# Altium footprint library asib.PcbLib: 45 footprints (part 3 of 3)
Each footprint in its own frame and in the unit in brackets; x right, y up, seen from the top. Pads: shape width x height; smd on the part's side, far side on the other; paste and mask are expansions set on the pad; w line width, h text height; cw(c..) or ccw(c..) is an arc to the next point about the centre after c.
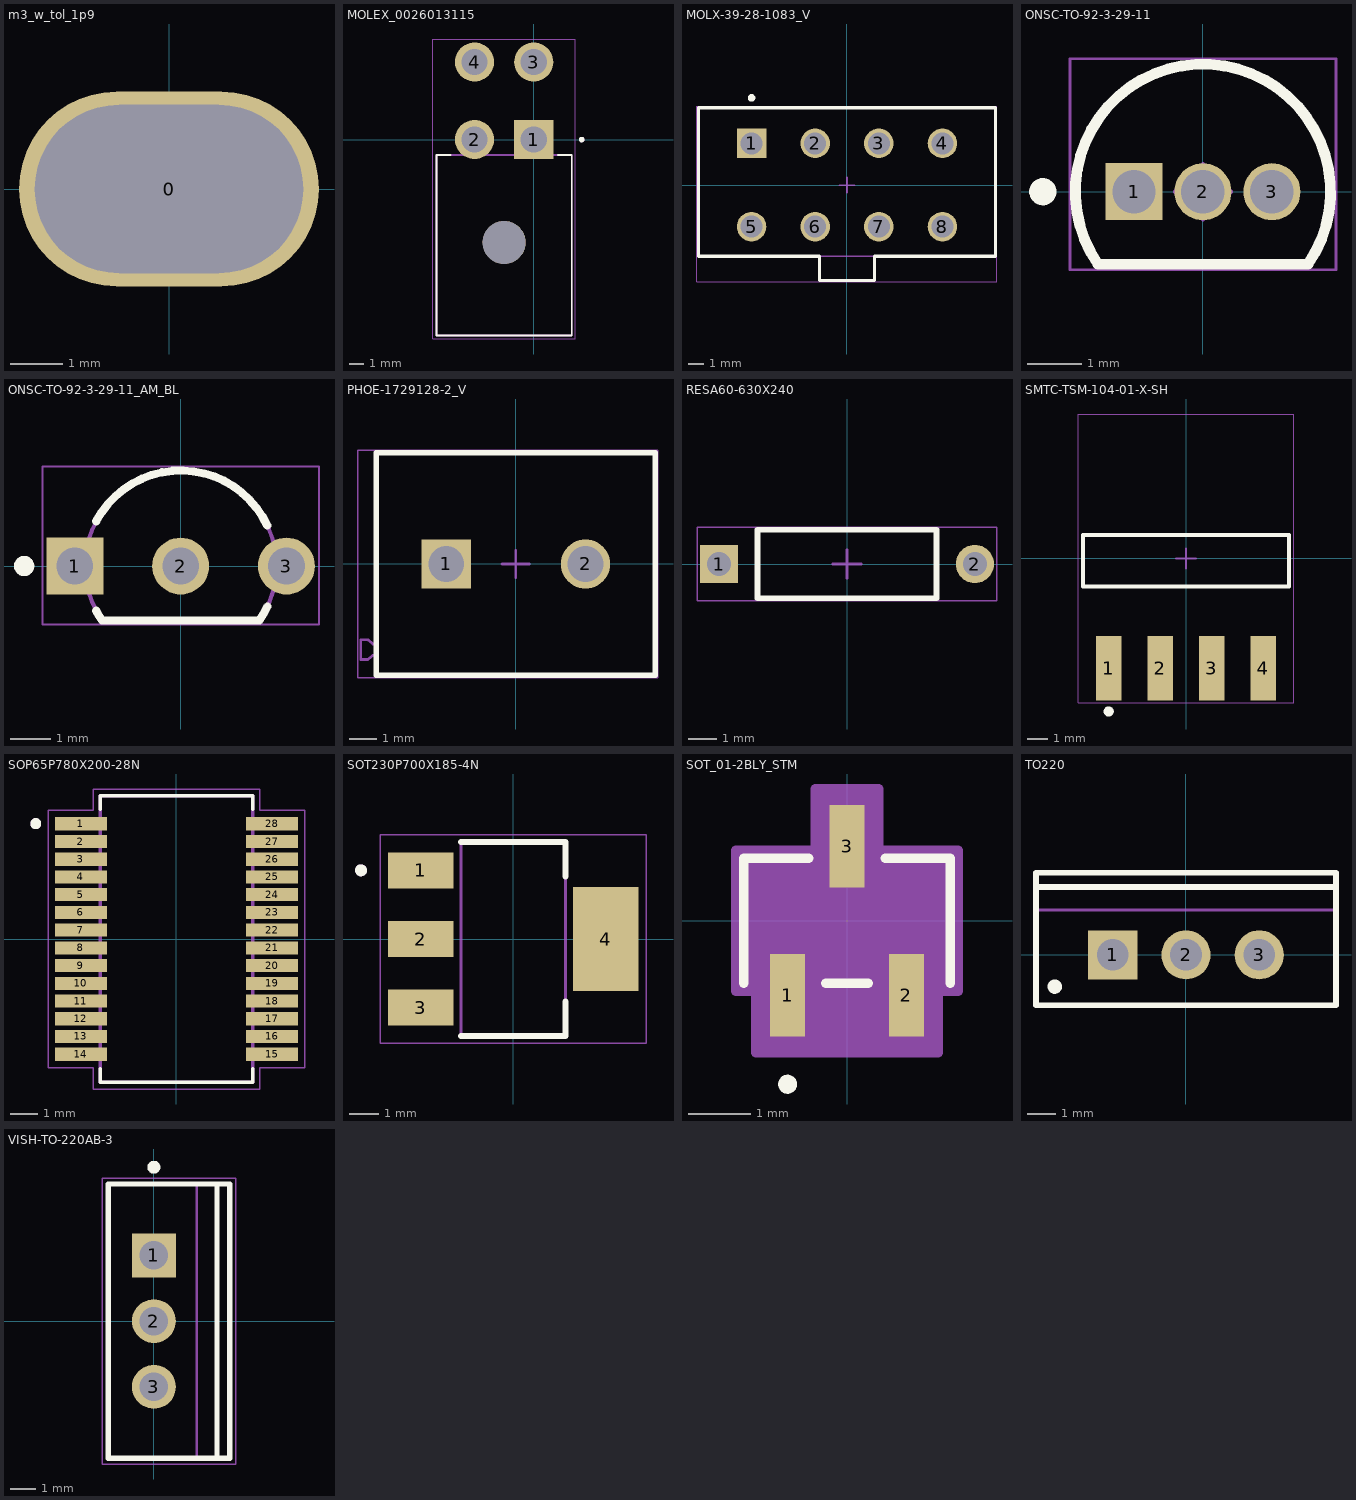
[diagram p2: the footprints below, top view; thin cyan lines are the x and y axes]

## m3_w_tol_1p9 [mm] "M3 with 1 axis 1.9mm tolerance"
pads (1):
  oval 5.7x3.7 hole 3.2 slot 5.1 at 0 deg: 0(0,0)

## MOLEX_0026013115 [mm]
pads (5):
  rect 2.775x2.775 hole 1.85: 1(0,0)
  round 2.775 hole 1.85: 2(-4.2,0) 3(0,5.5) 4(-4.2,5.5)
  round 3.05 hole 3.05 unplated: ""(-2.1,-7.3)
Top Overlay:
  circle w0.2: c3.4,0 r0.1
  lines w0.127: -5.91,-1.1 -6.9,-1.1 -6.9,-13.9 2.7,-13.9 2.7,-1.1 1.71,-1.1
Top 3D Body:
  circle w0.2: c3.4,0 r0.1
  lines w0.127: -6.9,-13.9 2.7,-13.9 2.7,-1.1 -6.9,-1.1 -6.9,-13.9
Top Courtyard:
  lines w0.05: -7.15,-14.15 2.95,-14.15 2.95,7.14 -7.15,7.14 -7.15,-14.15
3D body "0026013115--3DModel-STEP-56544.STEP": height 11.4, standoff -4.36, extent -6.822,-13.777 3.175,6.158

## MOLX-39-28-1083_V [mm] "PCB Header, 8-Leads, Vertical, Pitch 4.2 mm, Through Hole"
height 13.1
pads (8):
  rect 1.95x1.95 hole 1.45: 1(-6.3,2.75)
  round 1.95 hole 1.45: 2(-2.1,2.75) 3(2.1,2.75) 4(6.3,2.75) 5(-6.3,-2.75) 6(-2.1,-2.75) 7(2.1,-2.75) 8(6.3,-2.75)
Top Overlay:
  circle w0.25: c-6.3,5.75 r0.125
  lines w0.2: -9.8,-4.7 -1.8,-4.7 -1.8,-6.3 1.8,-6.3 1.8,-4.7 9.8,-4.7 9.8,5.1 -9.8,5.1 -9.8,-4.7
Top 3D Body:
  lines w0.1: -1.8,-4.7 -1.8,-6.3 1.8,-6.3 1.8,-4.7 ; -9.8,-4.7 -9.8,5.1 9.8,5.1 9.8,-4.7 -9.8,-4.7
Top Courtyard:
  lines w0.05: -9.9,-6.4 -9.9,5.2 9.9,5.2 9.9,-6.4 -9.9,-6.4
  lines w0.1: -0.5,0 0.5,0 ; 0,-0.5 0,0.5
3D body "039281083.stp": height 12.8, standoff -3.5, extent -9.4,-6 9.4,5

## ONSC-TO-92-3-29-11 [mm] "TO, 3-Leads, Body Dia 4.7mm, Pitch 1.27mm"
height 7.87
pads (3):
  rect 1.05x1.05 hole 0.8: 1(-1.27,0)
  round 1.05 hole 0.8: 2(0,0) 3(1.27,0)
Top Overlay:
  circle w0.25: c-2.95,0 r0.125
  lines w0.2: -1.934,-1.335 cw(c0,0) 1.934,-1.335 -1.934,-1.335
Top 3D Body:
  lines w0.1: -1.934,-1.335 cw(c0,0) 1.934,-1.335 -1.934,-1.335
Top Courtyard:
  lines w0.05: -2.45,-1.435 2.45,-1.435 2.45,2.45 -2.45,2.45 -2.45,-1.435
  lines w0.1: -0.5,0 0.5,0 ; 0,-0.5 0,0.5
3D body: height 7.87, standoff 2.54, extent -2.349,-1.334 2.357,2.359

## ONSC-TO-92-3-29-11_AM_BL [mm] "TO, 3-Leads, Body Dia 4.7mm, Pitch 2.6mm"
height 8.923
pads (3):
  rect 1.4x1.4 hole 0.9: 1(-2.6,0)
  round 1.4 hole 0.9: 2(0,0) 3(2.6,0)
Top Overlay:
  circle w0.25: c-3.85,0 r0.125
  lines w0.2: -2.077,-1.1 ccw(c0,0) -1.934,-1.335 1.934,-1.335 ccw(c0,0) 2.129,-0.994 ; -2.077,1.1 cw(c0,0) 2.129,0.994
Top 3D Body:
  lines w0.1: -1.934,-1.335 cw(c0,0) 1.934,-1.335 -1.934,-1.335
Top Courtyard:
  lines w0.05: -3.4,-1.435 3.4,-1.435 3.4,2.45 -3.4,2.45 -3.4,-1.435
  lines w0.1: -0.5,0 0.5,0 ; 0,-0.5 0,0.5
3D body: height 5.33, standoff 1.5, extent -2.359,-1.335 2.359,2.351
3D body "PCB3.step": height 4, standoff -8.7, extent -2.836,-0.222 2.836,0.223

## PHOE-1729128-2_V [mm] "Receptacle, 2-Leads, Body 8.1x10.16mm, Pitch 5.08mm"
height 10.013
pads (2):
  rect 1.8x1.8 hole 1.3: 1(-2.54,0)
  round 1.8 hole 1.3: 2(2.54,0)
Top Overlay:
  lines w0.2: -5.08,-4.05 -5.08,4.05 5.08,4.05 5.08,-4.05 -5.08,-4.05
Top 3D Body:
  lines w0.1: -5.08,-3.327 -5.209,-3.327 -5.387,-3.477 -5.65,-3.477 -5.65,-2.763 ; -5.08,-2.913 -5.209,-2.913 -5.387,-2.763 -5.65,-2.763 ; -5.65,-2.763 -5.65,-2.763 ; -5.08,-4.05 -5.08,4.05 5.08,4.05 5.08,-4.05 -5.08,-4.05
Top Courtyard:
  lines w0.05: -5.75,-4.15 -5.75,4.15 5.18,4.15 5.18,-4.15 -5.75,-4.15
  lines w0.1: -0.5,0 0.5,0 ; 0,-0.5 0,0.5
3D body "1729128.stp": height 10.01, standoff -3.49, extent -5.65,-4.05 5.08,4.05

## RESA60-630X240 [mm] "Axial Resistor, 2-Leads, Dia 2.4mm, Body Length 6.3mm"
height 2.6
pads (2):
  rect 1.35x1.35 hole 0.85: 1(-4.5,0)
  round 1.35 hole 0.85: 2(4.5,0)
Top Overlay:
  lines w0.2: -3.15,-1.2 -3.15,1.2 3.15,1.2 3.15,-1.2 -3.15,-1.2
Top 3D Body:
  lines w0.1: -3.15,-1.2 3.15,-1.2 3.15,1.2 -3.15,1.2 -3.15,-1.2
Top Courtyard:
  lines w0.05: -5.275,-1.3 -5.275,1.3 5.275,1.3 5.275,-1.3 -5.275,-1.3
  lines w0.1: -0.5,0 0.5,0 ; 0,-0.5 0,0.5
3D body: height 2.4, standoff 0, extent -3.15,-1.2 3.15,1.2

## SMTC-TSM-104-01-X-SH [mm] "Terminal Strip Single Surface Mount, 1x4 Pins, Horizontal, 2.54mm Pitch, Male"
height 3.05
pads (4):
  rect 1.27x3.18 smd: 1(-3.81,-5.402) 2(-1.27,-5.402) 3(1.27,-5.402) 4(3.81,-5.402)
Top Overlay:
  circle w0.25: c-3.81,-7.542 r0.125
  lines w0.2: -5.08,-1.392 -5.08,1.148 5.08,1.148 5.08,-1.392 -5.08,-1.392
Top 3D Body:
  lines w0.1: -5.08,-1.392 -5.08,1.148 5.08,1.148 5.08,-1.392 -5.08,-1.392
Top Courtyard:
  lines w0.05: -5.305,-7.117 5.305,-7.117 5.305,7.117 -5.305,7.117 -5.305,-7.117
  lines w0.1: -0.5,0 0.5,0 ; 0,-0.5 0,0.5
3D body "TSM-104-01-X-SH.step": height 3.05, standoff 0, extent -5.08,-5.962 5.08,6.992

## SOP65P780X200-28N [mm]
pads (28):
  rect 1.9x0.48 smd paste+0 mask+0.127: 1(-3.505,4.225) 2(-3.505,3.575) 3(-3.505,2.925) 4(-3.505,2.275) 5(-3.505,1.625) 6(-3.505,0.975) 7(-3.505,0.325) 8(-3.505,-0.325) 9(-3.505,-0.975) 10(-3.505,-1.625) 11(-3.505,-2.275) 12(-3.505,-2.925) 13(-3.505,-3.575) 14(-3.505,-4.225) 15(3.505,-4.225) 16(3.505,-3.575) 17(3.505,-2.925) 18(3.505,-2.275) 19(3.505,-1.625) 20(3.505,-0.975) 21(3.505,-0.325) 22(3.505,0.325) 23(3.505,0.975) 24(3.505,1.625) 25(3.505,2.275) 26(3.505,2.925) 27(3.505,3.575) 28(3.505,4.225)
Top Overlay:
  circle w0.2: c-5.16,4.23 r0.1
  lines w0.127: -2.8,-4.75 -2.8,-5.25 2.8,-5.25 2.8,-4.75 ; -2.8,4.75 -2.8,5.25 2.8,5.25 2.8,4.75
Top 3D Body:
  circle w0.2: c-5.16,4.23 r0.1
  lines w0.127: -2.8,-5.25 -2.8,5.25 2.8,5.25 2.8,-5.25 -2.8,-5.25
Top Courtyard:
  lines w0.05: -4.71,-4.72 -3.05,-4.72 -3.05,-5.5 3.05,-5.5 3.05,-4.72 4.71,-4.72 4.71,4.72 3.05,4.72 3.05,5.5 -3.05,5.5 -3.05,4.72 -4.71,4.72 -4.71,-4.72
3D body "MCP25625-E_SS.STEP": height 2, standoff 0, extent -3.9,-5.1 3.9,5.1

## SOT230P700X185-4N [mm]
pads (4):
  rect 2.2x1.2 smd: 1(-3.1,2.3) 2(-3.1,0) 3(-3.1,-2.3)
  rect 2.2x3.5 smd: 4(3.1,0)
Top Overlay:
  circle w0.2: c-5.1,2.3 r0.1
  lines w0.2: -1.75,-3.25 1.75,-3.25 1.75,-2.1 ; -1.75,3.25 1.75,3.25 1.75,2.1
Top 3D Body:
  circle w0.2: c-5.1,2.3 r0.1
  lines w0.1: -1.75,-3.25 -1.75,3.25 1.75,3.25 1.75,-3.25 -1.75,-3.25
Top Courtyard:
  lines w0.05: -4.45,-3.5 4.45,-3.5 4.45,3.5 -4.45,3.5 -4.45,-3.5
3D body "step_temp.STEP": height 1.65, standoff 0, extent -3.5,-3.25 3.5,3.25

## SOT_01-2BLY_STM [mil]
pads (3):
  rect 22x52 smd paste+0 mask+0: 1(-37.4,-47) 2(37.4,-47) 3(0,47)
Top Overlay:
  circle w6: c-37.4,-103 r3
  lines w6: -65,-39.5 -65,39.5 -24.1,39.5 ; -13.3,-39.5 13.3,-39.5 ; 24.1,39.5 65,39.5 65,-39.5
Top 3D Body:
  circle w0: c-37.4,-24.5 r3
  lines w1: -60,-34.5 60,-34.5 60,34.5 -60,34.5 -60,-34.5 ; -47.4,-59 -47.4,-34.5 -27.4,-34.5 -27.4,-59 -47.4,-59 ; -10,34.5 10,34.5 10,59 -10,59 -10,34.5 ; 27.4,-59 27.4,-34.5 47.4,-34.5 47.4,-59 27.4,-59
Top Courtyard:
  region: -70,-44.5 -70,44.5 -20,44.5 -20,83 20,83 20,44.5 70,44.5 70,-44.5 57.4,-44.5 57.4,-83 -57.4,-83 -57.4,-44.5
  lines w6: -70,-44.5 -70,44.5 -20,44.5 -20,83 20,83 20,44.5 70,44.5 70,-44.5 57.4,-44.5 57.4,-83 -57.4,-83 -57.4,-44.5 -70,-44.5
3D body "SOT_01-2BLY_STM.step": height 49.09, standoff 0, extent -60,-59.02 60,59.02

## TO220 [mm] "TO, Thru-Hole, Vertical, Heatsink Mounted; 3 In-Line Leads; Pitch 2.54 mm"
height 19.7
pads (3):
  rect 1.7x1.7 hole 1.1: 1(-2.54,0)
  round 1.7 hole 1.1: 2(0,0) 3(2.54,0)
Top Overlay:
  circle w0.25: c-4.55,-1.1 r0.125
  lines w0.2: -5.2,2.35 5.2,2.35 ; -5.2,-1.75 5.2,-1.75 5.2,2.85 -5.2,2.85 -5.2,-1.75
Top 3D Body:
  lines w0.1: -5.2,1.55 5.2,1.55 ; -5.2,-1.75 -5.2,2.85 5.2,2.85 5.2,-1.75 -5.2,-1.75
Top Courtyard:
  lines w0.1: -0.5,0 0.5,0 ; 0,-0.5 0,0.5
3D body: height 13.05, standoff 3.5, extent -5.25,-1.8 5.25,2.9
3D body: height 19.7, standoff 13.05, extent -5.199,1.551 5.199,2.849

## VISH-TO-220AB-3 [mm] "FM, 3-Leads, Body 10.55x4.65mm, Pitch 2.54mm"
height 19.31
pads (3):
  rect 1.7x1.7 hole 1.1: 1(0,2.54)
  round 1.7 hole 1.1: 2(0,0) 3(0,-2.54)
Top Overlay:
  circle w0.25: c0,5.95 r0.125
  lines w0.2: 2.435,-5.3 2.435,5.3 ; -1.765,-5.3 2.935,-5.3 2.935,5.3 -1.765,5.3 -1.765,-5.3
Top 3D Body:
  lines w0.1: 1.66,-5.275 1.66,5.275 ; -1.74,-5.275 -1.74,5.275 2.91,5.275 2.91,-5.275 -1.74,-5.275
Top Courtyard:
  lines w0.05: -1.99,-5.525 -1.99,5.525 3.16,5.525 3.16,-5.525 -1.99,-5.525
  lines w0.1: -0.5,0 0.5,0 ; 0,-0.5 0,0.5
3D body: height 3.32, standoff 0, extent -0.245,1.805 0.245,3.275
3D body: height 0, standoff -1.6, extent -0.245,2.115 0.245,2.965
3D body: height 3.32, standoff 0, extent -0.245,-0.735 0.245,0.735
3D body: height 0, standoff -1.6, extent -0.245,-0.425 0.245,0.425
3D body: height 3.32, standoff 0, extent -0.245,-3.275 0.245,-1.805
3D body: height 0, standoff -1.6, extent -0.245,-2.965 0.245,-2.115
3D body: height 13.01, standoff 3.32, extent -1.74,-5.275 2.91,5.275
3D body: height 14.64, standoff 13.01, extent 1.66,-5.15 2.91,5.15
3D body: height 14.68, standoff 14.64, extent 1.66,0.366 2.91,5.15
3D body: height 14.68, standoff 14.64, extent 1.66,-5.15 2.91,-0.366
3D body: height 18.39, standoff 18.35, extent 1.66,0.366 2.91,5.15
3D body: height 18.39, standoff 18.35, extent 1.66,-5.15 2.91,-0.366
3D body: height 14.78, standoff 14.67, extent 1.66,0.718 2.91,5.15
3D body: height 14.78, standoff 14.67, extent 1.66,-5.15 2.91,-0.718
3D body: height 18.35, standoff 18.24, extent 1.66,0.718 2.91,5.15
3D body: height 18.35, standoff 18.24, extent 1.66,-5.15 2.91,-0.718
3D body: height 14.96, standoff 14.78, extent 1.66,1.042 2.91,5.15
3D body: height 14.96, standoff 14.78, extent 1.66,-5.15 2.91,-1.042
3D body: height 18.25, standoff 18.07, extent 1.66,1.042 2.91,5.15
3D body: height 18.25, standoff 18.07, extent 1.66,-5.15 2.91,-1.042
3D body: height 15.19, standoff 14.95, extent 1.66,1.326 2.91,5.15
3D body: height 15.19, standoff 14.95, extent 1.66,-5.15 2.91,-1.326
3D body: height 18.07, standoff 17.84, extent 1.66,1.326 2.91,5.15
3D body: height 18.07, standoff 17.84, extent 1.66,-5.15 2.91,-1.326
3D body: height 15.47, standoff 15.18, extent 1.66,1.559 2.91,5.15
3D body: height 15.47, standoff 15.18, extent 1.66,-5.15 2.91,-1.559
3D body: height 17.84, standoff 17.55, extent 1.66,1.559 2.91,5.15
3D body: height 17.84, standoff 17.55, extent 1.66,-5.15 2.91,-1.559
3D body: height 15.8, standoff 15.47, extent 1.66,1.732 2.91,5.15
3D body: height 15.8, standoff 15.47, extent 1.66,-5.15 2.91,-1.732
3D body: height 17.56, standoff 17.23, extent 1.66,1.732 2.91,5.15
3D body: height 17.56, standoff 17.23, extent 1.66,-5.15 2.91,-1.732
3D body: height 16.15, standoff 15.79, extent 1.66,1.839 2.91,5.15
3D body: height 16.15, standoff 15.79, extent 1.66,-5.15 2.91,-1.839
3D body: height 17.23, standoff 16.88, extent 1.66,1.839 2.91,5.15
3D body: height 17.23, standoff 16.88, extent 1.66,-5.15 2.91,-1.839
3D body: height 16.51, standoff 16.14, extent 1.66,1.875 2.91,5.15
3D body: height 16.51, standoff 16.14, extent 1.66,-5.15 2.91,-1.875
3D body: height 16.88, standoff 16.51, extent 1.66,1.875 2.91,5.15
3D body: height 16.88, standoff 16.51, extent 1.66,-5.15 2.91,-1.875
3D body: height 19.31, standoff 18.39, extent 1.66,-5.15 2.91,5.15